# Altium footprint library my Library.PcbLib: 1247 footprints (part 3 of 78)
Each footprint in its own frame and in the unit in brackets; x right, y up, seen from the top. Pads: shape width x height; smd on the part's side, far side on the other; paste and mask are expansions set on the pad; w line width, h text height; cw(c..) or ccw(c..) is an arc to the next point about the centre after c.
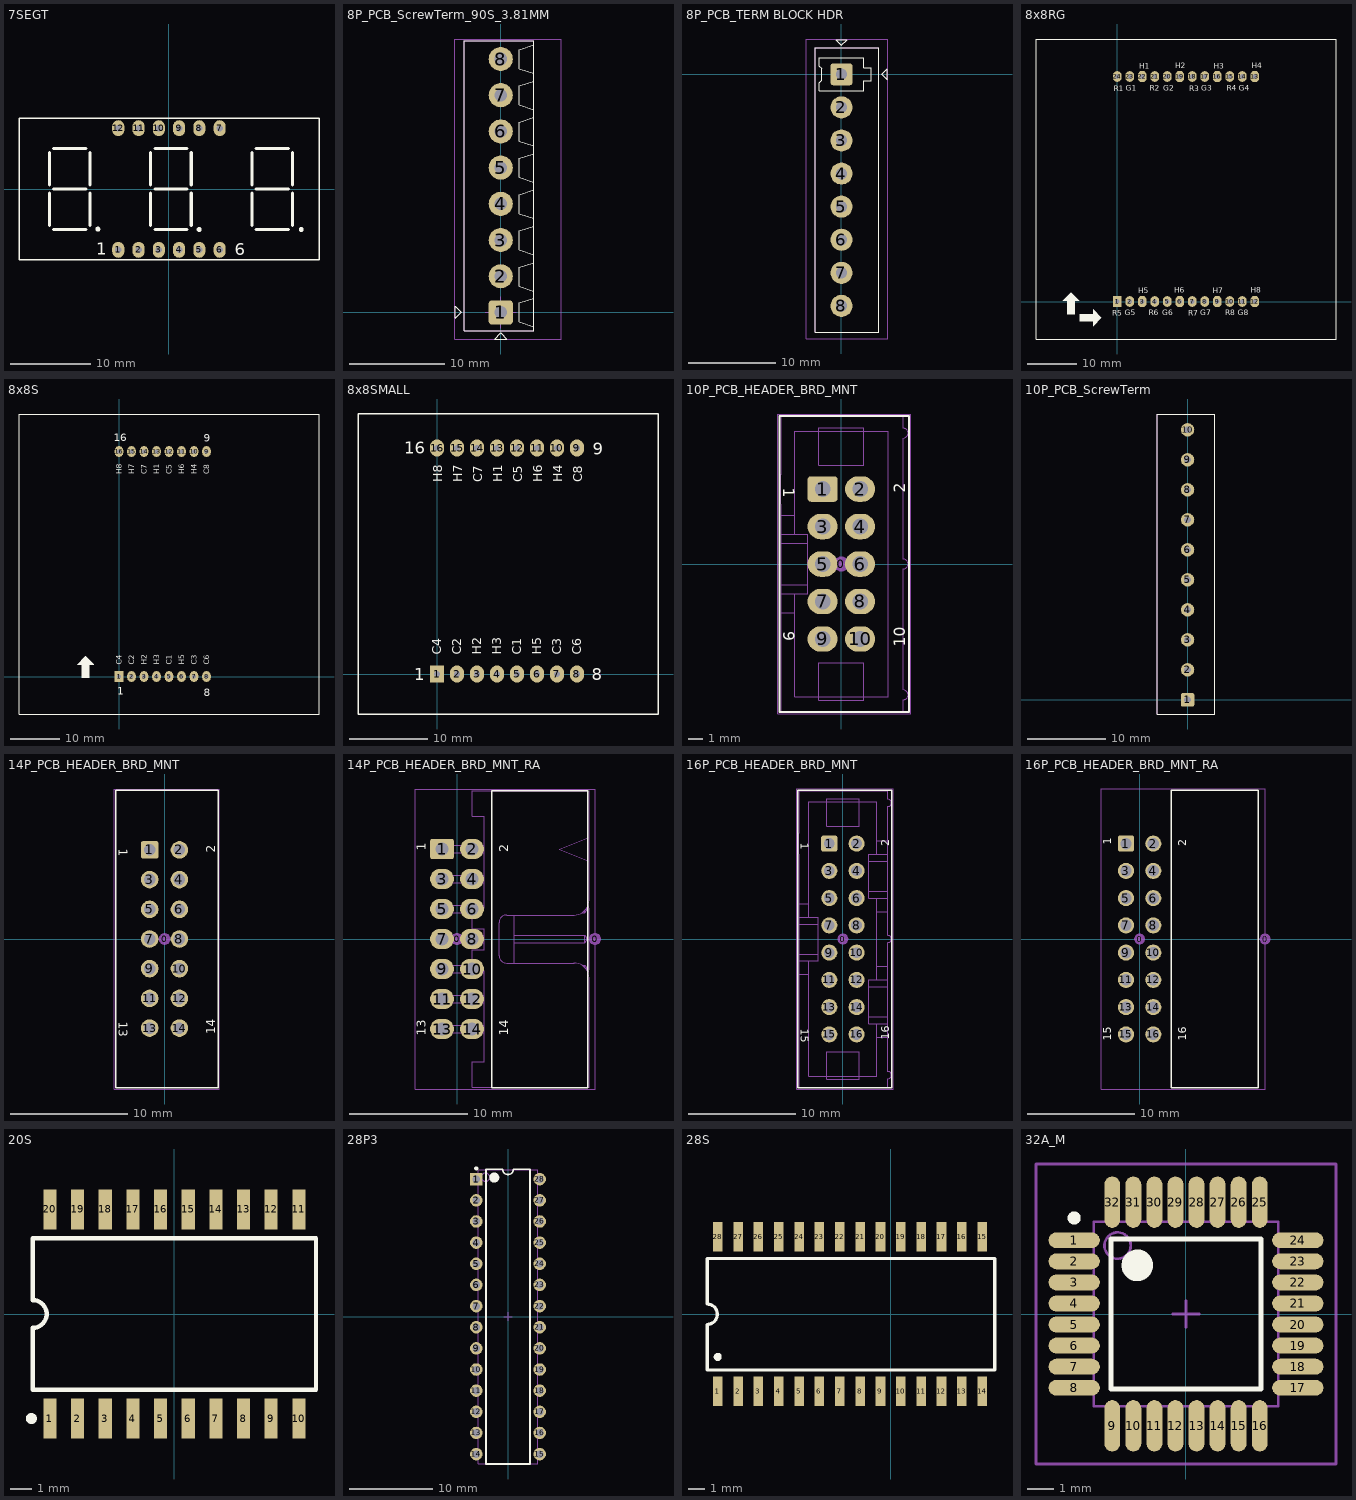
[diagram p2: the footprints below, top view; thin cyan lines are the x and y axes]

## 7SEGT [mm] "DIP 12 Leads; Body 48 x 20 mm; Pitch 0.5 mm"
height 7.62
pads (12):
  oval 1.524x2 hole 0.8: 1(-6.35,-7.62) 2(-3.81,-7.62) 3(-1.27,-7.62) 4(1.27,-7.62) 5(3.81,-7.62) 6(6.35,-7.62) 7(6.35,7.62) 8(3.81,7.62) 9(1.27,7.62) 10(-1.27,7.62) 11(-3.81,7.62) 12(-6.35,7.62)
Top Overlay:
  circle w0.305: c-8.915,-5.029 r0.152
  circle w0.305: c3.785,-5.08 r0.152
  circle w0.305: c16.586,-5.08 r0.152
  lines w0.178: -18.796,-8.89 18.804,-8.89 18.804,8.89 -18.796,8.89 -18.796,-8.89
  lines w0.381: -14.986,-4.572 -14.986,-0.508 ; -14.986,-4.572 -14.986,-0.508 ; -14.986,-4.572 -14.986,-0.508 ; -14.986,-4.572 -14.986,-0.508 ; -14.986,0.508 -14.986,4.572 ; -14.986,0.508 -14.986,4.572 ; -14.986,0.508 -14.986,4.572 ; -14.986,0.508 -14.986,4.572 ; -14.478,0 -10.414,0 ; -14.478,0 -10.414,0 ; -14.478,0 -10.414,0 ; -14.478,0 -10.414,0 ; -9.906,-4.572 -9.906,-0.508 ; -9.906,-4.572 -9.906,-0.508 ; -9.906,-4.572 -9.906,-0.508 ; -9.906,-4.572 -9.906,-0.508 ; -9.906,0.508 -9.906,4.572 ; -9.906,0.508 -9.906,4.572 ; -9.906,0.508 -9.906,4.572 ; -9.906,0.508 -9.906,4.572 ; -2.286,-4.572 -2.286,-0.508 ; -2.286,-4.572 -2.286,-0.508 ; -2.286,-4.572 -2.286,-0.508 ; -2.286,-4.572 -2.286,-0.508 ; -2.286,0.508 -2.286,4.572 ; -2.286,0.508 -2.286,4.572 ; -2.286,0.508 -2.286,4.572 ; -2.286,0.508 -2.286,4.572 ; -1.778,0 2.286,0 ; -1.778,0 2.286,0 ; -1.778,0 2.286,0 ; -1.778,0 2.286,0 ; 2.794,-4.572 2.794,-0.508 ; 2.794,-4.572 2.794,-0.508 ; 2.794,-4.572 2.794,-0.508 ; 2.794,-4.572 2.794,-0.508 ; 2.794,0.508 2.794,4.572 ; 2.794,0.508 2.794,4.572 ; 2.794,0.508 2.794,4.572 ; 2.794,0.508 2.794,4.572 ; 10.414,-4.572 10.414,-0.508 ; 10.414,-4.572 10.414,-0.508 ; 10.414,-4.572 10.414,-0.508 ; 10.414,-4.572 10.414,-0.508 ; 10.414,-4.572 10.414,-0.508 ; 10.414,-4.572 10.414,-0.508 ; 10.414,-4.572 10.414,-0.508 ; 10.414,-4.572 10.414,-0.508 ; 10.414,0.508 10.414,4.572 ; 10.414,0.508 10.414,4.572 ; 10.414,0.508 10.414,4.572 ; 10.414,0.508 10.414,4.572 ; 10.414,0.508 10.414,4.572 ; 10.414,0.508 10.414,4.572 ; 10.414,0.508 10.414,4.572 ; 10.414,0.508 10.414,4.572 ; 10.922,-5.08 14.986,-5.08 ; 10.922,-5.08 14.986,-5.08 ; 10.922,-5.08 14.986,-5.08 ; 10.922,-5.08 14.986,-5.08 ; 10.922,0 14.986,0 ; 10.922,0 14.986,0 ; 10.922,0 14.986,0 ; 10.922,0 14.986,0 ; 10.922,0 14.986,0 ; 10.922,0 14.986,0 ; 10.922,0 14.986,0 ; 10.922,0 14.986,0 ; 10.922,5.08 14.986,5.08 ; 10.922,5.08 14.986,5.08 ; 10.922,5.08 14.986,5.08 ; 10.922,5.08 14.986,5.08 ; 15.494,-4.572 15.494,-0.508 ; 15.494,-4.572 15.494,-0.508 ; 15.494,-4.572 15.494,-0.508 ; 15.494,-4.572 15.494,-0.508 ; 15.494,-4.572 15.494,-0.508 ; 15.494,-4.572 15.494,-0.508 ; 15.494,-4.572 15.494,-0.508 ; 15.494,-4.572 15.494,-0.508 ; 15.494,0.508 15.494,4.572 ; 15.494,0.508 15.494,4.572 ; 15.494,0.508 15.494,4.572 ; 15.494,0.508 15.494,4.572 ; 15.494,0.508 15.494,4.572 ; 15.494,0.508 15.494,4.572 ; 15.494,0.508 15.494,4.572 ; 15.494,0.508 15.494,4.572 ; -14.478,-5.08 -10.414,-5.08 -14.478,-5.08 ; -14.478,5.08 -10.414,5.08 -14.478,5.08 ; -1.778,-5.08 2.286,-5.08 -1.778,-5.08 ; -1.778,5.08 2.286,5.08 -1.778,5.08
  text "1" at -9.093,-8.23 h1.52
  text "6" at 8.255,-8.28 h1.52

## 8P_PCB_ScrewTerm_90S_3.81MM [mil] "TERM BLOCK 8POS SIDE ENT STACKABLE 3.81MM"
height 334.65
pads (8):
  rrect25% 100x100 hole 52: 1(0,0)
  round 100 hole 52: 2(0,150) 3(0,300) 4(0,450) 5(0,600) 6(0,750) 7(0,900) 8(0,1050)
Top Overlay:
  lines w5: 135.83,-59.06 76.78,-39.37 76.78,39.37 135.83,59.06 ; 135.83,88.58 76.78,108.27 76.78,187.01 135.83,206.69 ; 135.83,240 76.78,259.69 76.78,338.43 135.83,358.11 ; 135.83,390 76.78,409.69 76.78,488.43 135.83,508.11 ; 135.83,540 76.78,559.68 76.78,638.43 135.83,658.11 ; 135.83,690 76.78,709.68 76.78,788.43 135.83,808.11 ; 135.83,840 76.78,859.68 76.78,938.43 135.83,958.11 ; 135.83,990 76.78,1009.68 76.78,1088.43 135.83,1108.11 ; -188,-25 -188,25 -163,0 -188,-25 ; -151.57,-75 135.83,-75 135.83,1125 -151.57,1125 -151.57,-75 ; -25,-110 0,-85 25,-110 -25,-110
Mechanical 13:
  lines w3: -151.57,-75 -151.57,1125 135.83,1125 135.83,-75 -151.57,-75
Mechanical 15:
  lines w3: -65,0 65,0 ; 0,-65 0,65 ; -190,-110 250,-110 250,1132.88 -190,1132.88 -190,-110
3D body "c-1776113-8-o-3d.stp": height 335.25, standoff -137.2, extent -151.57,-75 135.83,1125

## 8P_PCB_TERM BLOCK HDR [mil] "TERM BLOCK HDR 8POS 3.81MM"
height 362.2
pads (8):
  rrect25% 100x100 hole 52: 1(0,0)
  round 100 hole 52: 2(0,-150) 3(0,-300) 4(0,-450) 5(0,-600) 6(0,-750) 7(0,-900) 8(0,-1050)
Top Overlay:
  lines w5: -120,-1170 170,-1170 170,120 -120,120 -120,-1170 ; -100,-75 100,-75 100,-30 135,-30 135,30 100,30 100,75 -100,75 -100,37.5 -90,27.5 -90,-27.5 -100,-37.5 -100,-75 ; -25,157 0,132 25,157 -25,157 ; 182,0 207,25 207,-25 182,0
Mechanical 13:
  lines w3: -120,-1170 -120,120 170,120 170,-1170 -120,-1170
Mechanical 15:
  lines w3: -160,-1200 210,-1200 210,160 -160,160 -160,-1200
3D body "c-0284517-08-c-3d.stp": height 362.8, standoff -133.26, extent -118.11,-1170.07 167.33,120.08
3D body: height 362.2, standoff 0, extent -120,-1170 170,120

## 8x8RG [mil] "Matran 8x8 2mau,Body 60 X 60mm"
height 300
pads (24):
  rect 70x85 hole 37.4: 1(0,0)
  oval 70x85 hole 37.4: 2(100,0) 4(300,0) 5(400,0) 7(600,0) 8(700,0) 10(900,0) 11(1000,0) 14(1000,1800) 15(900,1800) 17(700,1800) 18(600,1800) 20(400,1800) 21(300,1800) 23(100,1800) 24(0,1800)
  oct 70x85 hole 37.4: 3(200,0) 6(500,0) 9(800,0) 12(1100,0) 13(1100,1800) 16(800,1800) 19(500,1800) 22(200,1800)
Top Overlay:
  region: -437,5 -371,71 -369,71 -304,6 -304,5 -341,5 -341,-101 -400,-101 -400,5
  region: -193,-63 -127,-129 -127,-131 -192,-196 -193,-196 -193,-159 -299,-159 -299,-100 -193,-100
  lines w7: -650,-300 1750,-300 ; -650,-300 -650,2100 ; -650,-300 -650,2100 ; -650,2100 1750,2100 ; 1750,-300 1750,2100 ; 1750,-300 1750,2100
  text "R8" at 863,-111 h45
  text "G8" at 962,-110 h45
  text "H8" at 1068,69 h45
  text "R7" at 568,-112 h45
  text "G7" at 664,-111 h45
  text "H7" at 765,68 h45
  text "R6" at 250,-111 h45
  text "G6" at 358,-111 h45
  text "H6" at 456,69 h45
  text "H5" at 166,68 h45
  text "G5" at 60,-111 h45
  text "R5" at -40,-112 h45
  text "R1" at -28,1684 h45
  text "G1" at 68,1685 h45
  text "H1" at 174,1864 h45
  text "H2" at 464,1865 h45
  text "G2" at 366,1685 h45
  text "R2" at 258,1685 h45
  text "H3" at 773,1864 h45
  text "G3" at 672,1685 h45
  text "R3" at 576,1684 h45
  text "H4" at 1076,1865 h45
  text "G4" at 970,1686 h45
  text "R4" at 874,1685 h45
Bottom Overlay:
  text "R8" at 932,-111 h45
  text "G8" at 1031,-110 h45
  text "H8" at 1137,69 h45
  text "R7" at 637,-112 h45
  text "G7" at 733,-111 h45
  text "H7" at 834,68 h45
  text "R6" at 319,-111 h45
  text "G6" at 427,-111 h45
  text "H6" at 525,69 h45
  text "H5" at 235,68 h45
  text "G5" at 129,-111 h45
  text "R5" at 29,-112 h45
  text "R1" at 41,1684 h45
  text "G1" at 137,1685 h45
  text "H1" at 243,1864 h45
  text "H2" at 533,1865 h45
  text "G2" at 435,1685 h45
  text "R2" at 327,1685 h45
  text "H3" at 842,1864 h45
  text "G3" at 741,1685 h45
  text "R3" at 645,1684 h45
  text "H4" at 1145,1865 h45
  text "G4" at 1039,1686 h45
  text "R4" at 943,1685 h45

## 8x8S [mil] "Matran 8x8, Body 60 X 60mm"
height 300
pads (16):
  rect 70x85 hole 31: 1(0,0)
  oval 70x85 hole 31: 2(100,0) 3(200,0) 4(300,0) 5(400,0) 6(500,0) 7(600,0) 8(700,0) 9(700,1800) 10(600,1800) 11(500,1800) 12(400,1800) 13(300,1800) 14(200,1800) 15(100,1800) 16(0,1800)
Top Overlay:
  region: -336,96 -270,162 -268,162 -203,97 -203,96 -240,96 -240,-10 -299,-10 -299,96
  lines w7: -800,-300 1600,-300 ; -800,-300 1600,-300 ; -800,-300 -800,2100 ; -800,-300 -800,2100 ; -800,2100 1600,2100 ; -800,2100 1600,2100 ; 1600,-300 1600,2100 ; 1600,-300 1600,2100
  text "C8" at 722.49,1620 h45
  text "H8" at 22.49,1620 h45
  text "C7" at 222.49,1620 h45
  text "H7" at 122.49,1620 h45
  text "C6" at 722.49,96 h45
  text "H6" at 522.49,1620 h45
  text "H5" at 522.49,96 h45
  text "C5" at 422.49,1620 h45
  text "C1" at 422.49,96 h45
  text "C2" at 122.49,96 h45
  text "C3" at 622.49,96 h45
  text "C4" at 22.49,96 h45
  text "1" at -15,-144 h60
  text "8" at 678,-156 h60
  text "9" at 679,1880 h60
  text "16" at -42,1881 h60
  text "H4" at 622.49,1620 h45
  text "H3" at 322.49,96 h45
  text "H2" at 222.49,96 h45
  text "H1" at 322.49,1620 h45

## 8x8SMALL [mil] "M15088, Matrix 8x8 - Body 38 X 38mm"
height 314.96
pads (16):
  rect 70x85 hole 31: 1(0,0)
  oval 70x85 hole 31: 2(100,0) 3(200,0) 4(300,0) 5(400,0) 6(500,0) 7(600,0) 8(700,0) 9(700,1129.92) 10(600,1129.92) 11(500,1129.92) 12(400,1129.92) 13(300,1129.92) 14(200,1129.92) 15(100,1129.92) 16(0,1129.92)
Top Overlay:
  lines w7: -395,-200 1105,-200 1105,1300 -395,1300 -395,-200
  text "C8" at 727.49,960 h45
  text "H8" at 27.49,960 h45
  text "C7" at 227.49,960 h45
  text "H7" at 127.49,960 h45
  text "C6" at 722.49,96 h45
  text "H6" at 527.49,960 h45
  text "H5" at 522.49,96 h45
  text "C5" at 427.49,960 h45
  text "C1" at 422.49,96 h45
  text "C2" at 122.49,96 h45
  text "C3" at 622.49,96 h45
  text "C4" at 22.49,96 h45
  text "1" at -115,-30 h60
  text "8" at 775,-30 h60
  text "9" at 780,1095 h60
  text "16" at -165,1100 h60
  text "H4" at 627.49,960 h45
  text "H3" at 322.49,96 h45
  text "H2" at 222.49,96 h45
  text "H1" at 327.49,960 h45

## 10P_PCB_HEADER_BRD_MNT [mil] "HEADER BRD MNT 10POS 2.54MM"
height 390
pads (11):
  round 40 on Mech15: 0(0,0)
  rrect25% 80x68 hole 42: 1(-50,200)
  oval 80x68 hole 42: 2(50,200) 3(-50,100) 4(50,100) 5(-50,0) 6(50,0) 7(-50,-100) 8(50,-100) 9(-50,-200) 10(50,-200)
Top Overlay:
  lines w5: -165,-395 -165,395 180,395 180,-395 -165,-395
  text "2" at 170,190 h30
  text "1" at -155,203.57 h30
  text "10" at 170,-220.28 h30
  text "9" at -155,-179 h30
Mechanical 13:
  drawing of 154 lines, arcs and shapes, not listed
Mechanical 15:
  lines w3: -170,-400 -170,400 185,400 185,-400 -170,-400
3D body "D2510-6002-AR (10P).STEP": height 390, standoff -120, extent -161.99,-393.99 178.01,394.01

## 10P_PCB_ScrewTerm [mm] "TERM BLOCK 10POS SIDE ENT 3.81MM"
height 8.5
pads (10):
  rrect25% 1.7x1.7 hole 0.85: 1(0,0)
  round 1.7 hole 0.85: 2(0,3.81) 3(0,7.62) 4(0,11.43) 5(0,15.24) 6(0,19.05) 7(0,22.86) 8(0,26.67) 9(0,30.48) 10(0,34.29)
Top Overlay:
  lines w0.127: -3.85,-1.8 3.45,-1.8 3.45,36.3 -3.85,36.3 -3.85,-1.8
Mechanical 13:
  lines w0.076: -3.85,-1.8 -3.85,36.3 3.45,36.3 3.45,-1.8 -3.85,-1.8
3D body: height 8.5, standoff 0, extent -3.85,-1.8 3.45,36.3

## 14P_PCB_HEADER_BRD_MNT [mm] "HEADER BRD MNT 14POS 2.54MM"
height 9.906
pads (15):
  round 1.016 on Mech15: 0(0,0)
  rrect25% 1.5x1.5 hole 1: 1(-1.27,7.62)
  round 1.5 hole 1: 2(1.27,7.62) 3(-1.27,5.08) 4(1.27,5.08) 5(-1.27,2.54) 6(1.27,2.54) 7(-1.27,0) 8(1.27,0) 9(-1.27,-2.54) 10(1.27,-2.54) 11(-1.27,-5.08) 12(1.27,-5.08) 13(-1.27,-7.62) 14(1.27,-7.62)
Top Overlay:
  lines w0.127: -4.191,-12.7 -4.191,12.7 4.572,12.7 4.572,-12.7 -4.191,-12.7
  text "2" at 4.318,7.366 h0.76
  text "1" at -3.937,7.711 h0.76
  text "14" at 4.318,-8.135 h0.76
  text "13" at -3.937,-7.087 h0.76
Mechanical 15:
  lines w0.076: -4.318,-12.827 -4.318,12.827 4.699,12.827 4.699,-12.827 -4.318,-12.827
3D body "D2514-6002-AR (14P).STEP": height 9.91, standoff -3.05, extent -4.115,-12.547 4.521,12.548

## 14P_PCB_HEADER_BRD_MNT_RA [mil] "HEADER BRD MNT R/A 14POS 2.54MM"
height 338
pads (16):
  round 40 on Mech15: 0(0,0) 0(460,0)
  rrect25% 80x68 hole 42: 1(-50,300)
  oval 80x68 hole 42: 2(50,300) 3(-50,200) 4(50,200) 5(-50,100) 6(50,100) 7(-50,0) 8(50,0) 9(-50,-100) 10(50,-100) 11(-50,-200) 12(50,-200) 13(-50,-300) 14(50,-300)
Top Overlay:
  lines w5: 115,-495 435,-495 435,495 115,495 115,-495
  text "13" at -105,-323 h30
  text "14" at 170,-323 h30
  text "1" at -105,295 h30
  text "2" at 170,290 h30
Mechanical 13:
  lines w1.97: -17.5,-312.25 -17.5,-287.75 ; -17.5,-212.25 -17.5,-187.75 ; -17.5,-112.25 -17.5,-87.75 ; -17.5,-12.25 -17.5,12.25 ; -17.5,87.75 -17.5,112.25 ; -17.5,187.75 -17.5,212.25 ; -17.5,287.75 -17.5,312.25 ; 50,-87.75 -62.5,-87.75 -62.5,-112.25 90,-112.25 ; 50,87.75 -62.5,87.75 -62.5,112.25 90,112.25 ; 90,-312.25 -62.5,-312.25 -62.5,-287.75 90,-287.75 ; 90,-212.25 -62.5,-212.25 -62.5,-187.75 90,-187.75 ; 90,-12.25 -62.5,-12.25 -62.5,12.25 90,12.25 ; 90,187.75 -62.5,187.75 -62.5,212.25 90,212.25 ; 90,287.75 -62.5,287.75 -62.5,312.25 90,312.25 ; 190,-80 190,80 ; 190,-12.25 425,-12.25 ; 190,12.25 425,12.25 ; 416.74,-87.75 425,-87.75 ; 416.74,87.75 425,87.75 ; 425,-94.29 425,-87.75 ; 425,94.29 425,87.75 ; 433,-104.25 433,-95.75 425,-87.75 ; 433,104.25 433,95.75 425,87.75 ; 437.7,-115 ccw(c390,-100) 440,-100 440,100 ccw(c390,100) 437.7,115 ; 440,260 340,300 440,340 ; 425,-12.25 433,-4.25 433,4.25 425,12.25 ; 425,-12.25 425,12.25 ; 50,-494 50,-409 90,-409 90,-105 50,-105 50,-35 90,-35 90,35 50,35 50,105 90,105 90,409 50,409 50,494 440,494 440,130 cw(c390,130) 390,80 165,80 ccw(c165,55) 140,55 140,-55 ccw(c165,-55) 165,-80 390,-80 cw(c390,-130) 440,-130 440,-494 50,-494
Mechanical 15:
  lines w3: -140,-500 460,-500 460,500 -140,500 -140,-500
3D body "D2514-5002-AR (14P_RA).STEP": height 340, standoff -112, extent -62.49,-493.99 440.01,494.01

## 16P_PCB_HEADER_BRD_MNT [mm] "HEADER BRD MNT 16POS 2.54MM"
height 9.906
pads (17):
  round 1.016 on Mech15: 0(0,0)
  rrect25% 1.5x1.5 hole 1: 1(-1.27,8.89)
  round 1.5 hole 1: 2(1.27,8.89) 3(-1.27,6.35) 4(1.27,6.35) 5(-1.27,3.81) 6(1.27,3.81) 7(-1.27,1.27) 8(1.27,1.27) 9(-1.27,-1.27) 10(1.27,-1.27) 11(-1.27,-3.81) 12(1.27,-3.81) 13(-1.27,-6.35) 14(1.27,-6.35) 15(-1.27,-8.89) 16(1.27,-8.89)
Top Overlay:
  lines w0.127: -4.191,-13.843 -4.191,13.843 4.572,13.843 4.572,-13.843 -4.191,-13.843
  text "2" at 4.318,8.636 h0.76
  text "1" at -3.937,8.981 h0.76
  text "16" at 4.318,-9.405 h0.76
  text "15" at -3.937,-8.357 h0.76
Mechanical 13:
  drawing of 242 lines, arcs and shapes, not listed
Mechanical 15:
  lines w0.076: -4.318,-13.97 -4.318,13.97 4.699,13.97 4.699,-13.97 -4.318,-13.97
3D body "D2516-6002-AR (16P).STEP": height 9.91, standoff -3.05, extent -4.115,-13.817 4.521,13.818

## 16P_PCB_HEADER_BRD_MNT_RA [mm] "HEADER BRD MNT R/A 16POS 2.54MM"
height 8.585
pads (18):
  round 1.016 on Mech15: 0(0,0) 0(11.684,0)
  rrect25% 1.5x1.5 hole 1.067: 1(-1.27,8.89)
  round 1.5 hole 1.067: 2(1.27,8.89) 3(-1.27,6.35) 4(1.27,6.35) 5(-1.27,3.81) 6(1.27,3.81) 7(-1.27,1.27) 8(1.27,1.27) 9(-1.27,-1.27) 10(1.27,-1.27) 11(-1.27,-3.81) 12(1.27,-3.81) 13(-1.27,-6.35) 14(1.27,-6.35) 15(-1.27,-8.89) 16(1.27,-8.89)
Top Overlay:
  lines w0.127: 2.921,-13.843 11.049,-13.843 11.049,13.843 2.921,13.843 2.921,-13.843
  text "15" at -2.667,-9.474 h0.76
  text "16" at 4.318,-9.474 h0.76
  text "1" at -2.667,8.763 h0.76
  text "2" at 4.318,8.636 h0.76
Mechanical 15:
  lines w0.076: -3.556,-13.97 11.684,-13.97 11.684,13.97 -3.556,13.97 -3.556,-13.97
3D body "Box Header 3M 2516_RA.STEP": height 8.64, standoff -2.84, extent -1.581,-13.817 11.176,13.818

## 20S [mm] "Small Outline; 20 Leads; Body Width 7.5 mm; Pitch 1.27 mm"
height 2.67
pads (20):
  rect 0.6x1.85 smd: 1(-5.715,-4.8) 2(-4.445,-4.8) 3(-3.175,-4.8) 4(-1.905,-4.8) 5(-0.635,-4.8) 6(0.635,-4.8) 7(1.905,-4.8) 8(3.175,-4.8) 9(4.445,-4.8) 10(5.715,-4.8) 11(5.715,4.8) 12(4.445,4.8) 13(3.175,4.8) 14(1.905,4.8) 15(0.635,4.8) 16(-0.635,4.8) 17(-1.905,4.8) 18(-3.175,4.8) 19(-4.445,4.8) 20(-5.715,4.8)
Top Overlay:
  circle w0.25: c-6.565,-4.8 r0.125
  lines w0.2: -6.5,-3.475 -6.5,-0.635 ccw(c-6.5,0) -6.5,0.635 -6.5,3.475 6.5,3.475 6.5,-3.475 -6.5,-3.475

## 28P3 [mm]
pads (28):
  rect 1.5x1.5 hole 0.9: 1(-3.81,16.51)
  round 1.5 hole 0.9: 2(-3.81,13.97) 3(-3.81,11.43) 4(-3.81,8.89) 5(-3.81,6.35) 6(-3.81,3.81) 7(-3.81,1.27) 8(-3.81,-1.27) 9(-3.81,-3.81) 10(-3.81,-6.35) 11(-3.81,-8.89) 12(-3.81,-11.43) 13(-3.81,-13.97) 14(-3.81,-16.51) 15(3.81,-16.51) 16(3.81,-13.97) 17(3.81,-11.43) 18(3.81,-8.89) 19(3.81,-6.35) 20(3.81,-3.81) 21(3.81,-1.27) 22(3.81,1.27) 23(3.81,3.81) 24(3.81,6.35) 25(3.81,8.89) 26(3.81,11.43) 27(3.81,13.97) 28(3.81,16.51)
Top Overlay:
  circle w0.25: c-3.81,17.81 r0.125
  circle w0.6: c-1.65,16.7 r0.3
  lines w0.2: -2.65,-17.7 -2.65,17.7 -0.635,17.7 ccw(c0,17.7) 0.635,17.7 2.65,17.7 2.65,-17.7 -2.65,-17.7
Mechanical 13:
  circle w0.1: c-2.7,16.75 r0.5
  lines w0.1: -3.6,-17.65 -3.6,17.65 3.6,17.65 3.6,-17.65 -3.6,-17.65
Mechanical 15:
  lines w0.1: -0.5,0 0.5,0 ; 0,-0.5 0,0.5
3D body "User Library-ATmega 48_88_168 28P3.STEP": height 4.58, standoff -2.55, extent -4.88,-17.249 4.88,17.401

## 28S [mm] "Small Outline; 20 Leads; Body Width 7.5 mm; Pitch 1.27 mm"
height 2.67
pads (28):
  rect 0.6x1.85 smd: 1(-10.795,-4.8) 2(-9.525,-4.8) 3(-8.255,-4.8) 4(-6.985,-4.8) 5(-5.715,-4.8) 6(-4.445,-4.8) 7(-3.175,-4.8) 8(-1.905,-4.8) 9(-0.635,-4.8) 10(0.635,-4.8) 11(1.905,-4.8) 12(3.175,-4.8) 13(4.445,-4.8) 14(5.715,-4.8) 15(5.715,4.826) 16(4.445,4.826) 17(3.175,4.826) 18(1.905,4.826) 19(0.635,4.826) 20(-0.635,4.826) 21(-1.905,4.826) 22(-3.175,4.826) 23(-4.445,4.826) 24(-5.715,4.826) 25(-6.985,4.826) 26(-8.255,4.826) 27(-9.525,4.826) 28(-10.795,4.826)
Top Overlay:
  circle w0.25: c-10.793,-2.667 r0.125
  lines w0.2: -11.453,-3.475 -11.453,-0.635 ccw(c-11.453,0) -11.453,0.635 -11.453,3.475 ; -11.43,-3.475 6.5,-3.475 6.5,3.475 -11.43,3.475

## 32A_M [mm]
pads (32):
  oval 1.95x0.6 smd: 1(-4.25,2.8) 2(-4.25,2) 3(-4.25,1.2) 4(-4.25,0.4) 5(-4.25,-0.4) 6(-4.25,-1.2) 7(-4.25,-2) 8(-4.25,-2.8) 17(4.25,-2.8) 18(4.25,-2) 19(4.25,-1.2) 20(4.25,-0.4) 21(4.25,0.4) 22(4.25,1.2) 23(4.25,2) 24(4.25,2.8)
  oval 0.6x1.95 smd: 9(-2.8,-4.25) 10(-2,-4.25) 11(-1.2,-4.25) 12(-0.4,-4.25) 13(0.4,-4.25) 14(1.2,-4.25) 15(2,-4.25) 16(2.8,-4.25) 25(2.8,4.25) 26(2,4.25) 27(1.2,4.25) 28(0.4,4.25) 29(-0.4,4.25) 30(-1.2,4.25) 31(-2,4.25) 32(-2.8,4.25)
Top Overlay:
  circle w0.6: c-1.85,1.85 r0.3
  circle w0.25: c-4.25,3.65 r0.125
  lines w0.2: -2.85,-2.85 2.85,-2.85 2.85,2.85 -2.85,2.85 -2.85,-2.85
Mechanical 13:
  circle w0.1: c-2.6,2.6 r0.5
  lines w0.1: -3.5,-3.5 3.5,-3.5 3.5,3.5 -3.5,3.5 -3.5,-3.5
Mechanical 15:
  lines w0.1: -0.5,0 0.5,0 ; 0,-0.5 0,0.5 ; -5.7,-5.7 5.7,-5.7 5.7,5.7 -5.7,5.7 -5.7,-5.7
3D body: height 1.2, standoff 0, extent -3.5,-3.5 3.5,3.5